# Altium footprint library CDPcomponents.PcbLib: 12 footprints
Each footprint in its own frame and in the unit in brackets; x right, y up, seen from the top. Pads: shape width x height; smd on the part's side, far side on the other; paste and mask are expansions set on the pad; w line width, h text height; cw(c..) or ccw(c..) is an arc to the next point about the centre after c.
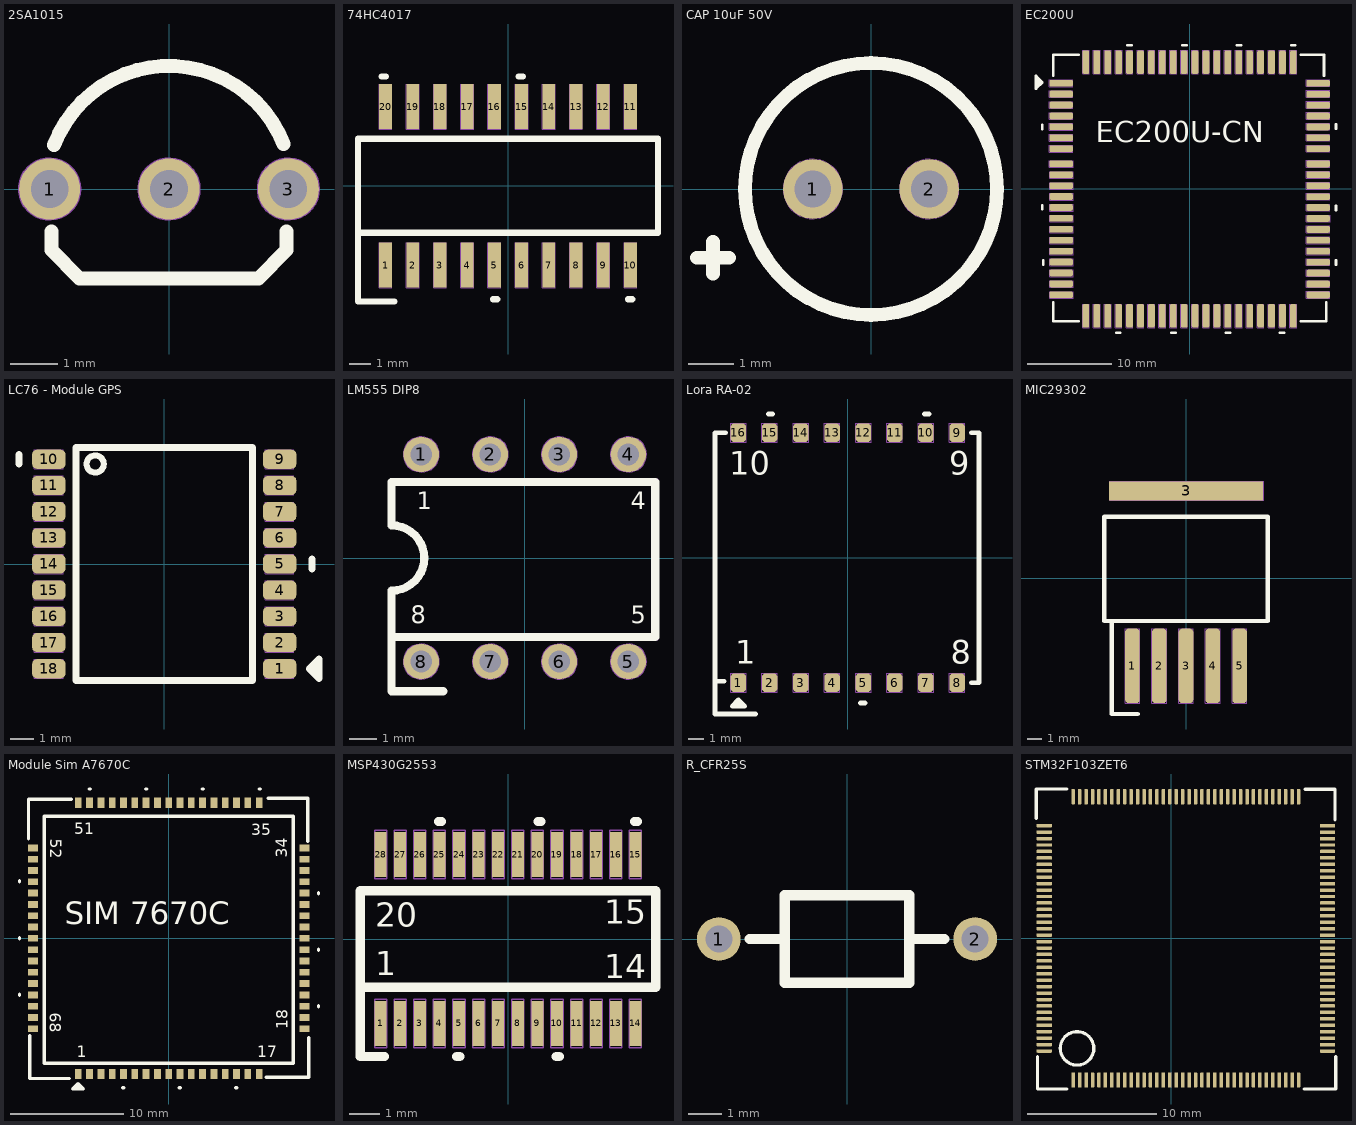
[diagram p0: the footprints below, top view; thin cyan lines are the x and y axes]

## 2SA1015 [mm] "2SA1015 (TO-92)"
height 4.8
pads (3):
  round 1.3 hole 0.8 mask+0.1: 1(-2.54,0) 2(0,0) 3(2.54,0)
Top Overlay:
  lines w0.3: -2.445,0.935 cw(c0,0) 2.437,0.954 ; 2.5,-0.9 2.5,-1.3 1.9,-1.9 -1.9,-1.9 -2.5,-1.3 -2.5,-0.9 ; -2.5,-0.9 -2.5,-0.9
Mechanical 1:
  circle w0.05: c-2.54,0 r0.65
  circle w0.05: c2.54,0 r0.65
  circle w0.05: c-2.54,0 r0.65
  circle w0.05: c0,0 r0.65
  lines w0.05: -2.5,-0.8 -2.5,-1.3 -1.9,-1.9 -1.275,-1.9 -0.025,-1.9 1.8,-1.9 2.5,-1.2 2.5,-0.8 ; -2.467,0.897 cw(c0,0) 2.48,0.859
3D body "User Library-TO-92_SS127.STEP": height 8.85, standoff -4.42, extent -4.227,-1.4 3.4,2.47

## 74HC4017 [mm] "74HC4017 (SO16-SOT109-1)"
height 1.45
pads (20):
  rect 0.6x2.1 smd mask+0.1: 1(-5.715,-3.7) 2(-4.445,-3.7) 3(-3.175,-3.7) 4(-1.905,-3.7) 5(-0.635,-3.7) 6(0.635,-3.7) 7(1.905,-3.7) 8(3.175,-3.7) 9(4.445,-3.7) 10(5.715,-3.7) 11(5.715,3.7) 12(4.445,3.7) 13(3.175,3.7) 14(1.905,3.7) 15(0.635,3.7) 16(-0.635,3.7) 17(-1.905,3.7) 18(-3.175,3.7) 19(-4.445,3.7) 20(-5.715,3.7)
Top Overlay:
  lines w0.3: -5.9,5.1 -5.7,5.1 ; -5.3,-5.4 -7,-5.4 -7,-2.2 ; -0.7,-5.3 -0.5,-5.3 ; 0.5,5.1 0.7,5.1 ; 5.6,-5.3 5.8,-5.3 ; -7,-2.2 -7,2.2 -0.45,2.2 7,2.2 7,-2.2 -7,-2.2
Mechanical 1:
  lines w0.05: -7,-2.2 -7,-1.665 -7,2.2 0.45,2.2 7,2.2 7,-2.2 -7,-2.2 ; -6.015,-4.75 -6.015,-2.65 -5.415,-2.65 -5.415,-4.75 -6.015,-4.75 ; -6.015,2.65 -5.415,2.65 -5.415,4.75 -6.015,4.75 -6.015,2.65 ; -4.745,-4.75 -4.145,-4.75 -4.145,-2.65 -4.745,-2.65 -4.745,-4.75 ; -4.745,2.65 -4.145,2.65 -4.145,4.75 -4.745,4.75 -4.745,2.65 ; -3.475,-4.75 -2.875,-4.75 -2.875,-2.65 -3.475,-2.65 -3.475,-4.75 ; -3.475,2.65 -2.875,2.65 -2.875,4.75 -3.475,4.75 -3.475,2.65 ; -2.205,-4.75 -1.605,-4.75 -1.605,-2.65 -2.205,-2.65 -2.205,-4.75 ; -2.205,2.65 -1.605,2.65 -1.605,4.75 -2.205,4.75 -2.205,2.65 ; -0.935,-4.75 -0.335,-4.75 -0.335,-2.65 -0.935,-2.65 -0.935,-4.75 ; -0.935,2.65 -0.335,2.65 -0.335,4.75 -0.935,4.75 -0.935,2.65 ; 0.335,-4.75 0.935,-4.75 0.935,-2.65 0.335,-2.65 0.335,-4.75 ; 0.335,2.65 0.935,2.65 0.935,4.75 0.335,4.75 0.335,2.65 ; 1.605,-4.75 2.205,-4.75 2.205,-2.65 1.605,-2.65 1.605,-4.75 ; 1.605,2.65 2.205,2.65 2.205,4.75 1.605,4.75 1.605,2.65 ; 2.875,-4.75 3.475,-4.75 3.475,-2.65 2.875,-2.65 2.875,-4.75 ; 2.875,2.65 3.475,2.65 3.475,4.75 2.875,4.75 2.875,2.65 ; 4.145,-4.75 4.745,-4.75 4.745,-2.65 4.145,-2.65 4.145,-4.75 ; 4.145,2.65 4.745,2.65 4.745,4.75 4.145,4.75 4.145,2.65 ; 5.415,-4.75 6.015,-4.75 6.015,-2.65 5.415,-2.65 5.415,-4.75 ; 5.415,2.65 6.015,2.65 6.015,4.75 5.415,4.75 5.415,2.65

## CAP 10uF 50V [mm] "Aluminum 10uF 50V"
height 13
pads (2):
  round 1.3 hole 0.8 mask+0.1: 1(-1.27,0) 2(1.27,0)
Top Overlay:
  circle w0.3: c0,0 r2.75
  lines w0.3: -3.8,-1.5 -3.1,-1.5 ; -3.45,-1.85 -3.45,-1.15
Mechanical 1:
  circle w0.05: c0,0 r2.75
  circle w0.01: c-1.27,0 r0.65
  circle w0.01: c1.27,0 r0.65
3D body "User Library-Capacitor 10uF 50V 7x5mm.STEP": height 7.74, standoff -2.32, extent -2.6,-2.31 2.43,2.7

## EC200U [mm] "EC200U - Quectel"
pads (80):
  rrect50% 2.8x0.8 smd: 1(-15.299,12.6) 2(-15.299,11.3) 3(-15.299,10) 4(-15.299,8.7) 5(-15.299,7.4) 6(-15.299,6.1) 7(-15.299,4.8) 8(-15.299,0.4) 9(-15.299,-0.9) 10(-15.299,-2.2) 11(-15.299,-3.5) 12(-15.299,-4.8) 13(-15.299,-6.1) 14(-15.299,-7.4) 15(-15.299,-8.7) 16(-15.299,-10) 17(-15.299,-11.3) 18(-15.299,-12.6) 37(15.299,-12.614) 38(15.299,-11.314) 39(15.299,-10.014) 40(15.299,-8.714) 41(15.299,-7.414) 42(15.299,-6.114) 43(15.299,-4.814) 44(15.299,-3.514) 45(15.299,-2.214) 46(15.299,-0.914) 47(15.299,0.386) 48(15.299,4.786) 49(15.299,6.086) 50(15.299,7.386) 51(15.299,8.686) 52(15.299,9.986) 53(15.299,11.286) 54(15.299,12.586) 141(-15.299,3) 142(-15.299,1.7) 144(15.299,2.986) 145(15.299,1.686)
  rrect50% 0.8x2.8 smd: 19(-9.749,-15.1) 20(-8.449,-15.1) 21(-7.149,-15.1) 22(-5.849,-15.1) 23(-4.549,-15.1) 24(-3.249,-15.1) 25(-1.949,-15.1) 26(-0.649,-15.1) 27(0.651,-15.1) 28(1.951,-15.1) 29(3.251,-15.1) 30(4.551,-15.1) 31(5.851,-15.1) 32(7.151,-15.1) 33(8.451,-15.1) 34(9.751,-15.1) 35(11.051,-15.1) 36(12.351,-15.1) 55(12.349,15.087) 56(11.049,15.087) 57(9.749,15.087) 58(8.449,15.087) 59(7.149,15.087) 60(5.849,15.087) 61(4.549,15.087) 62(3.249,15.087) 63(1.949,15.087) 64(0.649,15.087) 65(-0.651,15.087) 66(-1.951,15.087) 67(-3.251,15.087) 68(-4.551,15.087) 69(-5.851,15.087) 70(-7.151,15.087) 71(-8.451,15.087) 72(-9.753,15.088) 113(-11.053,15.088) 114(-12.349,15.1) 116(-12.349,-15.1) 117(-11.049,-15.1)
Top Overlay:
  lines w0.3: -18.288,12.192 -18.288,12.236 -18.274,12.236 -17.82,12.689 ; -18.288,12.7 -17.526,12.7 ; -18.034,12.827 -18.034,13.208 -17.526,12.7 ; -17.526,-2.421 -17.526,-1.913 ; -17.526,7.112 -17.526,7.62 ; -17.429,-8.992 -17.429,-8.484 ; -16.256,-13.462 -16.256,-15.748 -13.208,-15.748 ; -16.256,13.462 -16.256,16.002 -13.208,16.002 ; -8.749,-17.138 -8.241,-17.138 ; -7.396,17.135 -6.888,17.135 ; -2.186,-17.138 -1.678,-17.138 ; -0.864,17.135 -0.356,17.135 ; 4.312,-17.138 4.82,-17.138 ; 5.629,17.135 6.137,17.135 ; 10.749,-17.138 11.257,-17.138 ; 12.086,17.135 12.594,17.135 ; 13.208,-15.748 16.256,-15.748 16.256,-13.462 ; 13.208,16.002 16.002,16.002 16.002,13.462 ; 17.431,-8.998 17.431,-8.49 ; 17.431,-2.513 17.431,-2.005 ; 17.431,7.191 17.431,7.699 ; -17.526,12.7 -18.288,13.462 -18.288,11.938 -17.526,12.7
  text "EC200U-CN" at -11.184,5.58 h2.5
Mechanical 1:
  drawing of 580 lines, arcs and shapes, not listed
3D body "EC200U.stp": height 2.35, standoff -0.05, extent -15.649,-14.057 15.351,13.943

## LC76 - Module GPS [mm] "LC760Z00AAMD"
height 30
pads (19):
  rrect50% 1.4x0.8 smd: 1(4.85,-4.4) 1(4.85,-4.4) 2(4.85,-3.3) 3(4.85,-2.2) 4(4.85,-1.1) 5(4.85,0) 6(4.85,1.1) 7(4.85,2.2) 8(4.85,3.3) 9(4.85,4.4) 10(-4.85,4.4) 11(-4.85,3.3) 12(-4.85,2.2) 13(-4.85,1.1) 14(-4.85,0) 15(-4.85,-1.1) 16(-4.85,-2.2) 17(-4.85,-3.3) 18(-4.85,-4.4)
Top Overlay:
  circle w0.254: c-2.9,4.2 r0.361
  lines w0.3: -6.1,4.2 -6.1,4.6 ; 6.2,-0.2 6.2,0.2 ; 6.3,-4.4 6.5,-4.4 ; 6.5,-4.8 6.5,-4 6.1,-4.4 6.5,-4.8 ; 6.5,-4.8 6.5,-4.8 ; -3.7,-4.9 3.7,-4.9 3.7,4.9 0.15,4.9 -3.7,4.9 -3.7,-4.9
Mechanical 1:
  lines w0.05: -5.45,-4.8 -5.45,-4 -4.25,-4 -4.25,-4.8 -5.45,-4.8 ; -5.45,-3.7 -5.45,-2.9 -4.25,-2.9 -4.25,-3.7 -5.45,-3.7 ; -5.45,-2.6 -5.45,-1.8 -4.25,-1.8 -4.25,-2.6 -5.45,-2.6 ; -5.45,-1.5 -5.45,-0.7 -4.25,-0.7 -4.25,-1.5 -5.45,-1.5 ; -5.45,-0.4 -5.45,0.4 -4.25,0.4 -4.25,-0.4 -5.45,-0.4 ; -5.45,0.7 -5.45,1.5 -4.25,1.5 -4.25,0.7 -5.45,0.7 ; -5.45,1.8 -5.45,2.6 -4.25,2.6 -4.25,1.8 -5.45,1.8 ; -5.45,2.9 -5.45,3.7 -4.25,3.7 -4.25,2.9 -5.45,2.9 ; -5.45,4 -4.25,4 -4.25,4.8 -5.45,4.8 -5.45,4 ; 4.25,-4.8 5.45,-4.8 5.45,-4 4.25,-4 4.25,-4.8 ; 4.25,-3.7 4.25,-2.9 5.45,-2.9 5.45,-3.7 4.25,-3.7 ; 4.25,-2.6 4.25,-1.8 5.45,-1.8 5.45,-2.6 4.25,-2.6 ; 4.25,-1.5 4.25,-0.7 5.45,-0.7 5.45,-1.5 4.25,-1.5 ; 4.25,-0.4 4.25,0.4 5.45,0.4 5.45,-0.4 4.25,-0.4 ; 4.25,0.7 4.25,1.5 5.45,1.5 5.45,0.7 4.25,0.7 ; 4.25,1.8 4.25,2.6 5.45,2.6 5.45,1.8 4.25,1.8 ; 4.25,2.9 4.25,3.7 5.45,3.7 5.45,2.9 4.25,2.9 ; 4.25,4 4.25,4.8 5.45,4.8 5.45,4 4.25,4
3D body "Quectel L76-L.stp": height 2.51, standoff -0.01, extent -4.65,-5.05 5.05,5.05

## LM555 DIP8 [mm] "LM555 DIP8"
height 4.2
pads (8):
  round 1.3 hole 0.8 mask+0.1: 1(-3.81,3.81) 2(-1.27,3.81) 3(1.27,3.81) 4(3.81,3.81) 5(3.81,-3.81) 6(1.27,-3.81) 7(-1.27,-3.81) 8(-3.81,-3.81)
Top Overlay:
  lines w0.3: -3,-4.9 -4.9,-4.9 -4.9,-2.9 ; -4.9,-2.9 4.8,-2.9 4.8,2.8 -4.8,2.8 -4.9,2.8 -4.9,1.2 cw(c-4.9,0) -4.9,-1.2 -4.9,-2.9
  text "1" at -3.983,1.8 h0.65
  text "4" at 3.9,1.8 h0.65
  text "8" at -4.2,-2.4 h0.65
  text "5" at 3.9,-2.4 h0.65
Mechanical 1:
  circle w0.05: c-3.81,3.81 r0.65
  circle w0.05: c-1.27,3.81 r0.65
  circle w0.05: c1.27,3.81 r0.65
  circle w0.05: c3.81,3.81 r0.65
  circle w0.05: c-3.81,-3.81 r0.65
  circle w0.05: c-1.27,-3.81 r0.65
  circle w0.05: c1.27,-3.81 r0.65
  circle w0.05: c3.81,-3.81 r0.65
  lines w0.05: -4.9,-3 4.9,-3 4.9,2.9 -4.9,2.9 -4.9,1.237 cw(c-4.9,0) -4.9,-1.237 -4.9,-3
3D body "LM555CN.stp": height 5.21, standoff -2.37, extent -4.735,-4.202 4.536,4.002

## Lora RA-02 [mm] "Lora RA-02"
height 12
pads (16):
  rrect50% 1x1.2 smd: 1(-7,-8) 2(-5,-8) 3(-3,-8) 4(-1,-8) 5(1,-8) 6(3,-8) 7(5,-8) 8(7,-8) 9(7,8) 10(5,8) 11(3,8) 12(1,8) 13(-1,8) 14(-3,8) 15(-5,8) 16(-7,8)
Top Overlay:
  lines w0.3: -7.9,-7.9 -8.5,-7.9 ; -7.8,8 -8.5,8 -8.5,-7.9 ; -6.9,-9.3 -6.9,-9.2 ; -5.9,-10 -8.5,-10 -8.5,-7.9 ; -5.1,9.2 -4.8,9.2 ; 0.8,-9.3 1.1,-9.3 ; 4.9,9.2 5.2,9.2 ; 7.9,-8 8.4,-8 8.4,8 7.9,8 ; -7.4,-9.5 -6.6,-9.5 -7,-9.1 -7.4,-9.5
  text "1" at -7.2,-6.8 h1.5
  text "8" at 6.6,-6.8 h1.5
  text "9" at 6.5,5.3 h1.5
  text "10" at -7.6,5.3 h1.5
Mechanical 1:
  lines w0.05: -7.5,-8.6 -7.5,-7.4 ; -7.5,-8.6 -6.5,-8.6 ; -7.5,-8.6 -6.5,-8.6 ; -7.5,-8.6 -7.5,-7.4 ; -7.5,-7.4 -6.5,-7.4 ; -7.5,-7.4 -6.5,-7.4 ; -6.5,-8.6 -6.5,-7.4 ; -6.5,-8.6 -6.5,-7.4 ; 6.5,7.4 7.5,7.4 ; 6.5,7.4 6.5,8.6 ; 6.5,7.4 6.5,8.6 ; 6.5,7.4 7.5,7.4 ; 6.5,8.6 7.5,8.6 ; 6.5,8.6 7.5,8.6 ; 7.5,7.4 7.5,8.6 ; 7.5,7.4 7.5,8.6 ; -7.5,7.4 -6.5,7.4 -6.5,8.6 -7.5,8.6 -7.5,7.4 ; -5.5,-8.6 -4.5,-8.6 -4.5,-7.4 -5.5,-7.4 -5.5,-8.6 ; -5.5,7.4 -4.5,7.4 -4.5,8.6 -5.5,8.6 -5.5,7.4 ; -3.5,-8.6 -2.5,-8.6 -2.5,-7.4 -3.5,-7.4 -3.5,-8.6 ; -3.5,7.4 -2.5,7.4 -2.5,8.6 -3.5,8.6 -3.5,7.4 ; -1.5,-8.6 -0.5,-8.6 -0.5,-7.4 -1.5,-7.4 -1.5,-8.6 ; -1.5,7.4 -0.5,7.4 -0.5,8.6 -1.5,8.6 -1.5,7.4 ; 0.5,-8.6 1.5,-8.6 1.5,-7.4 0.5,-7.4 0.5,-8.6 ; 0.5,7.4 1.5,7.4 1.5,8.6 0.5,8.6 0.5,7.4 ; 2.5,-8.6 3.5,-8.6 3.5,-7.4 2.5,-7.4 2.5,-8.6 ; 2.5,7.4 3.5,7.4 3.5,8.6 2.5,8.6 2.5,7.4 ; 4.5,-8.6 5.5,-8.6 5.5,-7.4 4.5,-7.4 4.5,-8.6 ; 4.5,7.4 5.5,7.4 5.5,8.6 4.5,8.6 4.5,7.4 ; 6.5,-8.6 7.5,-8.6 7.5,-7.4 6.5,-7.4 6.5,-8.6
3D body "User Library-RA-02-2.STEP": height 3.2, standoff 0, extent -8.5,-8 8.5,8

## MIC29302 [mm]
pads (6):
  rrect50% 1x5.1 smd: 1(-3.66,-5.978) 2(-1.83,-5.978) 3(0,-5.978) 4(1.83,-5.978) 5(3.66,-5.978)
  rect 10.5x1.3 smd: 3(0,5.978)
Top Overlay:
  lines w0.3: -5.08,-2.912 -5.08,-9.262 -3.302,-9.262 ; -5.59,-2.912 -5.59,4.2 5.59,4.2 5.59,-2.912 -5.59,-2.912
Mechanical 1:
  lines w0.05: 0.045,6.621 -5.205,6.621 ; -5.205,6.621 -5.205,5.321 5.295,5.321 5.295,6.621 -5.205,6.621 ; -4.16,-8.528 -3.16,-8.528 ; -4.16,-8.528 -4.16,-3.428 ; -4.16,-8.528 -3.16,-8.528 ; -4.16,-8.528 -4.16,-3.428 ; -4.16,-3.428 -3.66,-3.428 ; -4.16,-3.428 -3.66,-3.428 ; -3.66,-3.428 -3.16,-3.428 ; -3.66,-3.428 -3.16,-3.428 ; -3.16,-8.528 -3.16,-3.428 ; -3.16,-8.528 -3.16,-3.428 ; -2.331,-8.528 -1.331,-8.528 -1.331,-3.428 -1.831,-3.428 -2.331,-3.428 -2.331,-8.528 ; -0.502,-8.528 0.498,-8.528 0.498,-3.428 -0.002,-3.428 -0.502,-3.428 -0.502,-8.528 ; 1.327,-8.528 2.327,-8.528 2.327,-3.428 1.827,-3.428 1.327,-3.428 1.327,-8.528 ; 3.156,-8.528 4.156,-8.528 4.156,-3.428 3.656,-3.428 3.156,-3.428 3.156,-8.528
3D body "User Library-MIC29302.STEP": height 4.06, standoff -0.25, extent -5.055,-7.085 4.597,6.383

## Module Sim A7670C [mm] "Module Sim A7670C"
height 15
pads (68):
  rect 0.6x0.9 smd mask+0.1: 1(-8,-12) 2(-7,-12) 3(-6,-12) 4(-5,-12) 5(-4,-12) 6(-3,-12) 7(-2,-12) 8(-1,-12) 9(0,-12) 10(1,-12) 11(2,-12) 12(3,-12) 13(4,-12) 14(5,-12) 15(6,-12) 16(7,-12) 17(8,-12) 35(8,12) 36(7,12) 37(6,12) 38(5,12) 39(4,12) 40(3,12) 41(2,12) 42(1,12) 43(0,12) 44(-1,12) 45(-2,12) 46(-3,12) 47(-4,12) 48(-5,12) 49(-6,12) 50(-7,12) 51(-8,12)
  rect 0.9x0.6 smd mask+0.1: 18(12,-8) 19(12,-7) 20(12,-6) 21(12,-5) 22(12,-4) 23(12,-3) 24(12,-2) 25(12,-1) 26(12,0) 27(12,1) 28(12,2) 29(12,3) 30(12,4) 31(12,5) 32(12,6) 33(12,7) 34(12,8) 52(-12,8) 53(-12,7) 54(-12,6) 55(-12,5) 56(-12,4) 57(-12,3) 58(-12,2) 59(-12,1) 60(-12,0) 61(-12,-1) 62(-12,-2) 63(-12,-3) 64(-12,-4) 65(-12,-5) 66(-12,-6) 67(-12,-7) 68(-12,-8)
Top Overlay:
  lines w0.3: -13.2,-5.04 -13.2,-4.94 ; -13.2,-0.05 -13.2,0.05 ; -13.2,4.98 -13.2,5.08 ; -12.4,8.8 -12.4,12.3 -8.6,12.3 ; -12.3,-8.6 -12.3,-12.4 -8.8,-12.4 ; -11,-10.85 -11,10.8 11,10.8 11,-11.05 -11,-11.05 -11,-0.65 ; -8.2,-13.3 -7.9,-13 ; -7.03,13.21 -6.93,13.21 ; -4.07,-13.21 -3.97,-13.21 ; -2.03,13.21 -1.93,13.21 ; 0.94,-13.21 1.04,-13.21 ; 2.97,13.21 3.07,13.21 ; 5.94,-13.21 6.04,-13.21 ; 7.99,13.21 8.09,13.21 ; 8.6,-12.3 12.4,-12.3 12.4,-8.8 ; 8.8,12.4 12.3,12.4 12.3,8.6 ; 13.25,-6.06 13.25,-5.96 ; 13.25,-1.06 13.25,-0.96 ; 13.25,3.93 13.25,4.03 ; -8.475,-13.325 -8.025,-12.875 -7.575,-13.325 -8.475,-13.325
  text "SIM 7670C" at -9.21,1.23 h2
  text "68" at -10.52,-6.56 h1
  text "52" at -10.47,8.81 h1
  text "51" at -8.34,9.22 h1
  text "35" at 7.31,9.12 h1
  text "34" at 10.5,7.144 h1
  text "18" at 10.54,-8.06 h1
  text "17" at 7.81,-10.51 h1
  text "1" at -8.14,-10.51 h1
3D body "User Library-A7670.STEP": height 2.3, standoff 0, extent -12,-12 12,12

## MSP430G2553 [mm] "MSP430G2553 (PW-G28)"
height 1.4
pads (28):
  rect 0.4x1.5 smd mask+0.1: 1(-4.225,-2.8) 2(-3.575,-2.8) 3(-2.925,-2.8) 4(-2.275,-2.8) 5(-1.625,-2.8) 6(-0.975,-2.8) 7(-0.325,-2.8) 8(0.325,-2.8) 9(0.975,-2.8) 10(1.625,-2.8) 11(2.275,-2.8) 12(2.925,-2.8) 13(3.575,-2.8) 14(4.225,-2.8) 15(4.225,2.8) 16(3.575,2.8) 17(2.925,2.8) 18(2.275,2.8) 19(1.625,2.8) 20(0.975,2.8) 21(0.325,2.8) 22(-0.325,2.8) 23(-0.975,2.8) 24(-1.625,2.8) 25(-2.275,2.8) 26(-2.925,2.8) 27(-3.575,2.8) 28(-4.225,2.8)
Top Overlay:
  lines w0.3: -4.1,-3.9 -4.9,-3.9 -4.9,-1.6 ; -2.3,3.9 -2.2,3.9 ; -1.7,-3.9 -1.6,-3.9 ; 1,3.9 1.1,3.9 ; 1.6,-3.9 1.7,-3.9 ; 4.2,3.9 4.3,3.9 ; -4.9,-1.6 4.9,-1.6 4.9,1.6 -0.65,1.6 -4.9,1.6 -4.9,-1.6
  text "1" at -4.4,-1.2 h0.8
  text "14" at 3.2,-1.3 h0.8
  text "15" at 3.2,0.5 h0.8
  text "20" at -4.4,0.4 h0.8
Mechanical 1:
  drawing of 155 lines, arcs and shapes, not listed
3D body "MSP430G2553IPW28.stp": height 1.2, standoff 0, extent -4.85,-3.2 4.85,3.2

## R_CFR25S [mm] "R 1/4W"
height 2.1
pads (2):
  round 1.3 hole 0.8 mask+0.1: 1(-3.81,0) 2(3.81,0)
Top Overlay:
  lines w0.3: -2.9,0 -1.85,0 ; 1.85,0 2.9,0 ; -1.85,-1.3 -1.85,1.3 1.85,1.3 1.85,-1.3 -1.85,-1.3
Mechanical 1:
  circle w0.05: c-3.81,0 r0.583
  circle w0.05: c3.81,0 r0.583
  lines w0.05: -3,0 -1.85,0 ; 1.85,0 3,0 ; -1.85,-1.3 -1.85,1.3 0,1.3 1.85,1.3 1.85,-1.3 -1.85,-1.3

## STM32F103ZET6 [mm] "STM32F103ZET6 - LQFP144"
height 12
pads (145):
  rrect50% 0.27x1.2 smd: 1(-7.625,-11) 1(-7.625,-11) 2(-7.125,-11) 3(-6.625,-11) 4(-6.125,-11) 5(-5.625,-11) 6(-5.125,-11) 7(-4.625,-11) 8(-4.125,-11) 9(-3.625,-11) 10(-3.125,-11) 11(-2.625,-11) 12(-2.125,-11) 13(-1.625,-11) 14(-1.125,-11) 15(-0.625,-11) 16(-0.125,-11) 17(0.375,-11) 18(0.875,-11) 19(1.375,-11) 20(1.875,-11) 21(2.375,-11) 22(2.875,-11) 23(3.375,-11) 24(3.875,-11) 25(4.375,-11) 26(4.875,-11) 27(5.375,-11) 28(5.875,-11) 29(6.375,-11) 30(6.875,-11) 31(7.375,-11) 32(7.875,-11) 33(8.375,-11) 34(8.875,-11) 35(9.375,-11) 36(9.875,-11) 073(9.875,11) 074(9.375,11) 075(8.875,11) 076(8.375,11) 077(7.875,11) 078(7.375,11) 079(6.875,11) 080(6.375,11) 081(5.875,11) 082(5.375,11) 083(4.875,11) 084(4.375,11) 085(3.875,11) 086(3.375,11) 087(2.875,11) 088(2.375,11) 089(1.875,11) 090(1.375,11) 091(0.875,11) 092(0.375,11) 093(-0.125,11) 094(-0.625,11) 095(-1.125,11) 096(-1.625,11) 097(-2.125,11) 098(-2.625,11) 099(-3.125,11) 100(-3.625,11) 101(-4.125,11) 102(-4.625,11) 103(-5.125,11) 104(-5.625,11) 105(-6.125,11) 106(-6.625,11) 107(-7.125,11) 108(-7.625,11)
  rrect50% 1.2x0.27 smd: 37(12.125,-8.75) 38(12.125,-8.25) 39(12.125,-7.75) 40(12.125,-7.25) 41(12.125,-6.75) 42(12.125,-6.25) 43(12.125,-5.75) 44(12.125,-5.25) 45(12.125,-4.75) 46(12.125,-4.25) 47(12.125,-3.75) 48(12.125,-3.25) 49(12.125,-2.75) 50(12.125,-2.25) 51(12.125,-1.75) 52(12.125,-1.25) 53(12.125,-0.75) 54(12.125,-0.25) 55(12.125,0.25) 56(12.125,0.75) 57(12.125,1.25) 58(12.125,1.75) 59(12.125,2.25) 60(12.125,2.75) 61(12.125,3.25) 62(12.125,3.75) 63(12.125,4.25) 64(12.125,4.75) 65(12.125,5.25) 66(12.125,5.75) 67(12.125,6.25) 68(12.125,6.75) 69(12.125,7.25) 70(12.125,7.75) 71(12.125,8.25) 72(12.125,8.75) 109(-9.875,8.75) 110(-9.875,8.25) 111(-9.875,7.75) 112(-9.875,7.25) 113(-9.875,6.75) 114(-9.875,6.25) 115(-9.875,5.75) 116(-9.875,5.25) 117(-9.875,4.75) 118(-9.875,4.25) 119(-9.875,3.75) 120(-9.875,3.25) 121(-9.875,2.75) 122(-9.875,2.25) 123(-9.875,1.75) 124(-9.875,1.25) 125(-9.875,0.75) 126(-9.875,0.25) 127(-9.875,-0.25) 128(-9.875,-0.75) 129(-9.875,-1.25) 130(-9.875,-1.75) 131(-9.875,-2.25) 132(-9.875,-2.75) 133(-9.875,-3.25) 134(-9.875,-3.75) 135(-9.875,-4.25) 136(-9.875,-4.75) 137(-9.875,-5.25) 138(-9.875,-5.75) 139(-9.875,-6.25) 140(-9.875,-6.75) 141(-9.875,-7.25) 142(-9.875,-7.75) 143(-9.875,-8.25) 144(-9.875,-8.75)
Top Overlay:
  circle w0.254: c-7.323,-8.543 r1.3
  lines w0.254: -10.5,9.3 -10.5,11.6 -8.1,11.6 ; -10.4,-9.2 -10.4,-11.7 -8.1,-11.7 ; 10.3,-11.7 12.768,-11.7 12.768,-9.2 ; 10.4,11.59 12.7,11.59 12.7,9.2
3D body "STM32F103ZET6TR.stp": height 1.6, standoff 0, extent -9.876,-10.994 12.124,11.006